# Altium schematic symbol library Electronic Devices_LIB.SchLib: 703 symbols (part 5 of 8) (continued)
## IC_POWER_SW_TPS27081ADDCR (continued)
IC LOAD SW HIGH SIDE 6SOT; Manufacturer: Texas Instruments; Number of Outputs: 1; Output Current: 3A; Max Power Dissipation: 1.19W; Max Supply Voltage: 8V; Min Supply Voltage: 1.2V; On-State Resistance: 155mR; Interface: On/Off; Number of Drivers: 2; Supplier 1: Digikey; Manufacturer Part Number: TPS27081ADDCR; RoHS: Yes; Category: Hot Swap Controllers; Stock 1: 25350; Pricing 1: 1=0.87, 10=0.768, 25=0.7212, 100=0.5885, 250=0.54668, 500=0.46524, 1000=0.3722 (USD); Mount: Surface Mount; Case/Package: SOT-23-6; Number of Pins: 6; Weight: 0.00127oz; Min Operating Temperature: -40°C; Max Operating Temperature: 85°C; Packaging: Tape and Reel; Package Quantity: 3000; Max Output Current: 3A; Power Dissipation: 1.19W; Number of Channels: 1; Output Configuration: High Side; Series: -; Length: 3.02mm; Width: 1.75mm; Height: 0.8mm; Radiation Hardening: No; Reach SVHC Compliant: No; Lead Free: Lead Free; RoHS Compliant: Yes; ComponentLink1URL: https://datasheet.ciiva.com/23784/1759795-23784067.pdf?src-supplier=Newark; ComponentLink1Description: https://datasheet.ciiva.com/23784/1759795-23784067.pdf?src-supplier=Newark; ComponentLink2URL: https://datasheet.ciiva.com/22629/tps27081a-22629123.pdf?src-supplier=Element14; ComponentLink2Description: https://datasheet.ciiva.com/22629/tps27081a-22629123.pdf?src-supplier=Element14; ComponentLink3URL: https://datasheet.ciiva.com/6602/tps27081a-6602781.pdf?src-supplier=Digikey; ComponentLink3Description: https://datasheet.ciiva.com/6602/tps27081a-6602781.pdf?src-supplier=Digikey; ComponentLink4URL: https://datasheet.ciiva.com/6602/tps27081a-6602782.pdf?src-supplier=Digikey; ComponentLink4Description: https://datasheet.ciiva.com/6602/tps27081a-6602782.pdf?src-supplier=Digikey; ComponentLink5URL: https://datasheet.ciiva.com/6602/tps27081a-6602783.pdf?src-supplier=Digikey; ComponentLink5Description: https://datasheet.ciiva.com/6602/tps27081a-6602783.pdf?src-supplier=Digikey; ComponentLink6URL: https://datasheet.ciiva.com/26909/getdatasheetpartid-643010-26909270.pdf?src-supplier=Verical; ComponentLink6Description: https://datasheet.ciiva.com/26909/getdatasheetpartid-643010-26909270.pdf?src-supplier=Verical; ComponentLink7URL: https://datasheet.ciiva.com/14247/tps27081a-14247815.pdf?src-supplier=Avnet; ComponentLink7Description: https://datasheet.ciiva.com/14247/tps27081a-14247815.pdf?src-supplier=Avnet; ComponentLink8URL: https://datasheet.ciiva.com/14248/tps27081a-14248285.pdf?src-supplier=Avnet; ComponentLink8Description: https://datasheet.ciiva.com/14248/tps27081a-14248285.pdf?src-supplier=Avnet; Supplier Part Number 1: 296-34970-1-ND
footprint IC_POWER_SW_SOT95P280X110-6N (SOT-23-THIN)
pins: 1 R2, 2 VOUT_1, 3 VOUT_2, 4 VIN, 5 ON/OFF, 6 R1/C1

## IC_PROTECTION_USB_TYPEC_NX20P0407UKZ
designator U?, comment NX20P0407UKZ
IC USB TYPE C PROTECTION +15KV/+8KV ESD WLCSP12; Manufacturer: NXP Semiconductors; Supplier 1: Digikey; Manufacturer Part Number: NX20P0407UKZ; RoHS: No; Stock 1: 96420; Pricing 1: 1=1.73, 10=1.44, 100=1.1464, 500=0.97006, 1000=0.82309, 2000=0.78194, 5000=0.75254 (USD); Supplier Part Number 1: 568-15315-1-ND
footprint IC_PROTECTION_USBC_BGA12C40P3X4_127X167X56
pins: A1 CON__CC1, A2 CC1, A3 VSYS, B1 CON__CC2, B2 CC2, B3 GND, C1 CON__SBU1, C2 SBU1, C3 FLAG, D1 CON__SBU2, D2 SBU2, D3 SBUEN

## IC_PUSHB_ONOFF_MAX16054AZT+T
designator U?, comment MAX16054AZT+T
MAX16054 Series 5.5 V Surface Mount Pushbutton On/Off Controller - TSOT-23-6; Manufacturer: Analog Devices; Max Power Dissipation: 727mW; Max Supply Voltage: 5.5V; Min Supply Voltage: 2.7V; Number of Voltages Monitored: 1; Operating Supply Current: 7uA; Undervoltage Threshold: 1.8V; Watchdog Timer: No; Output Type: 10620OutputType; Supplier 1: Newark; Manufacturer Part Number: MAX16054AZT+T; RoHS: No; Category: Interface ICs; Stock 1: 3185; Pricing 1: 1=2.01, 10=1.85, 25=1.85, 50=1.85, 100=1.71, 250=1.71, 500=1.71, 1000=1.58 (USD); Mount: Surface Mount; Case/Package: SOT-23-6; Number of Pins: 6; Contact Plating: Tin; Min Operating Temperature: -40°C; Max Operating Temperature: 125°C; Packaging: Cut Tape; Nominal Supply Current: 7uA; Number of Outputs: 1; Length: 4mm; Width: 4mm; Height: 1.1mm; Radiation Hardening: No; Reach SVHC Compliant: Unknown; Supplier Part Number 1: 73Y2456
footprint IC_SOT95P275X110-6N
pins: 1 IN, 2 GND, 3 CLEAR, 4 ~{OUT}, 5 OUT, 6 VCC

## IC_REG_BOOST_5V_1.5A_TPS61023DRLT
designator U?, comment TPS61023DRLT
3.7-A boost converter with 0.5-V ultra-low input voltage 6-SOT-5X3 -40 to 125; Manufacturer: Texas Instruments; Output Type: Adjustable; Output Configuration: Positive; Number of Outputs: 1; Min Input Voltage: 500mV; Max Input Voltage: 5.5V; Min Output Voltage: 2.2V; Output Current: 3A; Switching Frequency: 1MHz; Synchronous Rectifier: Yes; Supplier 1: Digikey; Manufacturer Part Number: TPS61023DRLT; RoHS: Yes; Category: Voltage Regulators - Switching; Stock 1: 20677; Pricing 1: 1=1.18, 10=1.052, 25=0.9984, 100=0.82 (USD); Mount: Surface Mount; Case/Package: SOT-563; Min Operating Temperature: -40°C; Max Operating Temperature: 125°C; Topology: Boost; Series: -; Max Output Voltage: 5.5V; ComponentLink1URL: http://www.ti.com/general/docs/suppproductinfo.tsp?distId=10&amp;gotoUrl=http%3A%2F%2Fwww.ti.com%2Flit%2Fgpn%2Ftps61023&src-supplier=Digikey; ComponentLink1Description: http://www.ti.com/general/docs/suppproductinfo.tsp?distId=10&amp;gotoUrl=http%3A%2F%2Fwww.ti.com%2Flit%2Fgpn%2Ftps61023&src-supplier=Digikey; Supplier Part Number 1: 296-TPS61023DRLTCT-ND
footprint IC_REG_BOOST_SOTFL50P160X60-6N (SOT-563)
pins: 1 FB, 2 EN, 3 VIN, 4 GND, 5 SW, 6 VOUT

## IC_REG_BOOST_5V_1A_PAM2401SCADJ
designator U?, comment PAM2401SCADJ
Conv DC-DC 0.9V to 4.75V Synchronous Step Up Single-Out 2.5V to 5V 8-Pin MSOP T/R; Manufacturer: Diodes; Number of Outputs: 1; Min Input Voltage: 900mV; Output Current: 3A; Switching Frequency: 1MHz; Synchronous Rectifier: Yes; Operating Supply Current: 1uA; Topology: Boost; Output Type: Adjustable; Output Configuration: Positive; Supplier 1: Digikey; Manufacturer Part Number: PAM2401SCADJ; RoHS: Yes; Category: Voltage Regulators - Switching; Stock 1: 13690; Pricing 1: 1=1, 10=0.894, 25=0.8484, 100=0.6969, 250=0.65144, 500=0.5757, 1000=0.4545 (USD); Mount: Surface Mount; Case/Package: MSOP; Weight: 0.004938oz; Min Operating Temperature: -40°C; Max Operating Temperature: 85°C; Packaging: Tape and Reel; Max Input Voltage: 4.75V; Min Output Voltage: 2.5V; Max Output Voltage: 5V; Package Quantity: 2500; Min Supply Voltage: 900mV; Series: -; Number of Channels: 1; Lead Free: Lead Free; RoHS Compliant: Yes; ComponentLink1URL: http://www.mouser.com/ds/2/115/PAM2401-347378.pdf?src-supplier=Mouser; ComponentLink1Description: http://www.mouser.com/ds/2/115/PAM2401-347378.pdf?src-supplier=Mouser; ComponentLink2URL: https://www.diodes.com/assets/Datasheets/PAM2401.pdf?src-supplier=Digikey; ComponentLink2Description: https://www.diodes.com/assets/Datasheets/PAM2401.pdf?src-supplier=Digikey; ComponentLink3URL: http://diodes.com/datasheets/PAM2401.pdf?src-supplier=Avnet; ComponentLink3Description: http://diodes.com/datasheets/PAM2401.pdf?src-supplier=Avnet; Supplier Part Number 1: PAM2401SCADJDICT-ND

## IC_REG_BOOST_8A_TPS61089RNRR
designator U?, comment TPS61089RNRR
Conv DC-DC 2.7V to 12V Synchronous Step Up Single-Out 4.5V to 12.6V 7A 11-Pin VQFN-HR T/R; Manufacturer: Texas Instruments; Number of Outputs: 1; Switching Frequency: 2.2MHz; Synchronous Rectifier: Yes; Quiescent Current: 10uA; Topology: Boost; Output Type: Adjustable; Output Configuration: Positive; Supplier 1: Mouser; Manufacturer Part Number: TPS61089RNRR; RoHS: Yes; Category: Voltage Regulators - Switching; Stock 1: 27007; Pricing 1: 1=2.62, 10=2.35, 50=2.35, 100=1.89, 250=1.77, 500=1.55, 1000=1.28, 3000=1.19, 6000=1.15, 9000=1.11, 10000=1.15 (USD); Mount: Surface Mount; Case/Package: VQFN; Number of Pins: 11; Min Operating Temperature: -40°C; Max Operating Temperature: 85°C; Packaging: Tape and Reel; Min Input Voltage: 2.7V; Max Input Voltage: 12V; Min Output Voltage: 4.5V; Max Output Voltage: 12.6V; Output Current: 7A; Series: -; Lead Free: Lead Free; RoHS Compliant: Yes; Supplier Part Number 1: 595-TPS61089RNRR
footprint IC_REG_BOOST_TPS61089RNRR (11-VQFN-HR (2.5x2))
pins: 1 FSW (in), 2 VCC (out), 3 FB (in), 4 COMP (out), 5 GND (power), 6 VOUT (out), 7 EN (in), 8 ILIM (out), 9 VIN (in), 10 BOOT (out), 11 SW (out)

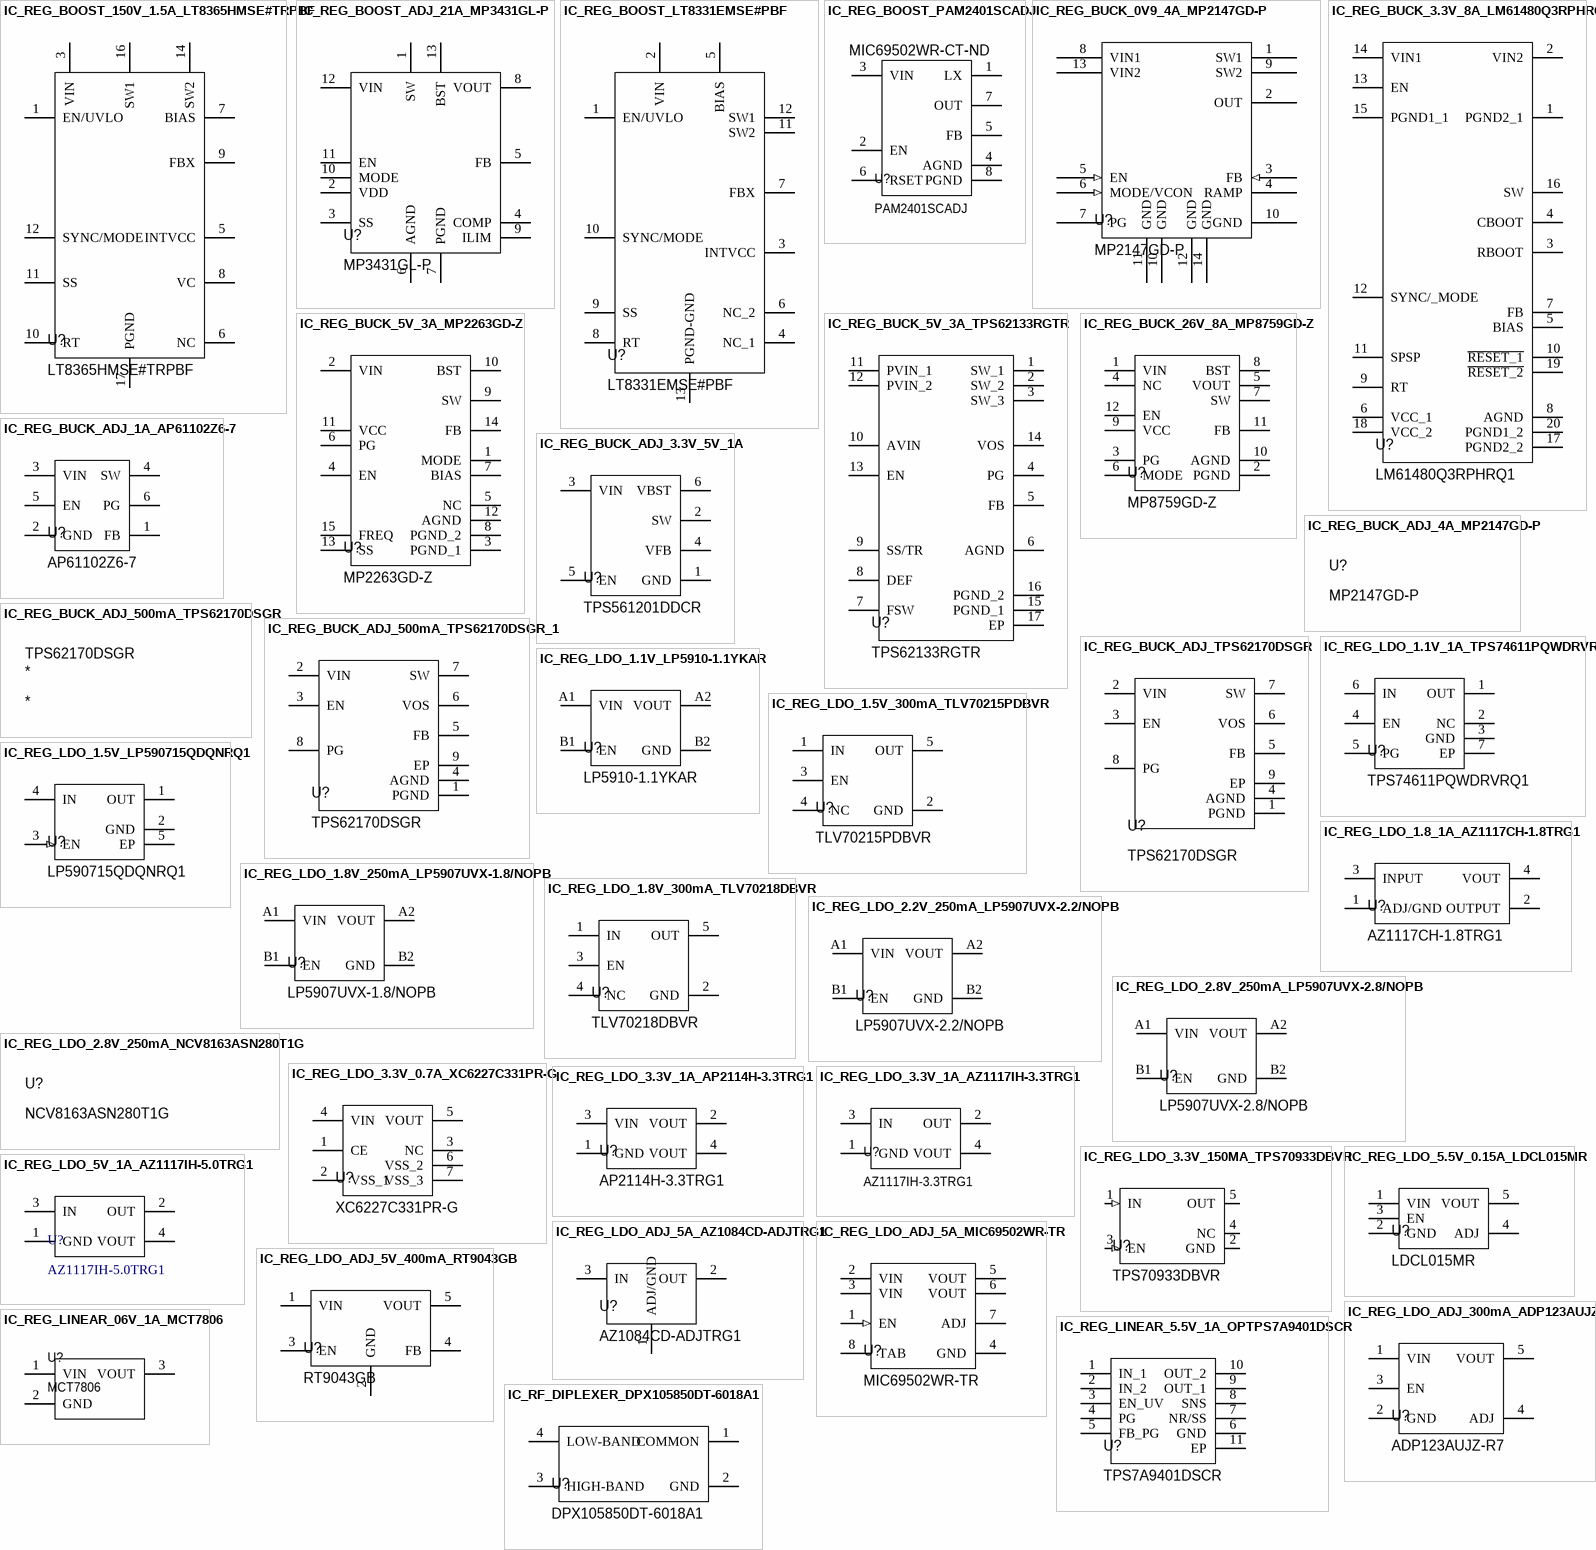
[diagram p26: symbols IC_REG_BOOST_150V_1.5A_LT8365HMSE#TRPBF to IC_RF_DIPLEXER_DPX105850DT-6018A1]

## IC_REG_BOOST_150V_1.5A_LT8365HMSE#TRPBF
designator U?, comment LT8365HMSE#TRPBF
60 Vin Boost/sepic/inv Conv 1.5A/; Manufacturer: Analog Devices; Supplier 1: Mouser; Manufacturer Part Number: LT8365HMSE#TRPBF; RoHS: Yes; Category: Voltage Regulators - Switching; Stock 1: 7423; Pricing 1: 1=7.4, 10=6.69, 50=6.38, 100=5.54, 1000=4.2, 10000=3.75 (USD); Supplier Part Number 1: 584-LT8365HMSE#TRPBF
footprint IC_BOOST_MSE16(12) (16-MSOP-EP)
pins: 1 EN/UVLO, 3 VIN, 5 INTVCC, 6 NC, 7 BIAS, 8 VC, 9 FBX, 10 RT, 11 SS, 12 SYNC/MODE, 14 SW2, 16 SW1, 17 PGND

## IC_REG_BOOST_ADJ_21A_MP3431GL-P
designator U?, comment MP3431GL-P
21A, High-Efficiency, Fully Integrated, Synchronous, Boost Converter with Progra; Manufacturer: Monolithic Power Systems; Supplier 1: Mouser; Manufacturer Part Number: MP3431GL-P; RoHS: No; Category: Voltage Regulators - Switching; Stock 1: 7933; Pricing 1: 1=4.68, 10=3.64, 50=3.64, 100=3.62, 250=3.15, 500=2.13, 1000=1.79, 2500=1.7, 5000=1.64, 10000=1.7 (USD); Mount: Surface Mount; Case/Package: QFN; Number of Pins: 13; Packaging: Tape and Reel; Series: *; ComponentLink1URL: https://datasheet.octopart.com/MP3431GL-P-Monolithic-Power-Systems-datasheet-156108963.pdf?src-supplier=Monolithic+Power+Systems; ComponentLink1Description: https://datasheet.octopart.com/MP3431GL-P-Monolithic-Power-Systems-datasheet-156108963.pdf?src-supplier=Monolithic+Power+Systems; Supplier Part Number 1: 946-MP3431GL-P
footprint IC_REG_BOOST_MP3431GLP (QFN-13)
pins: 1 SW, 2 VDD, 3 SS, 4 COMP, 5 FB, 6 AGND, 7 PGND, 8 VOUT, 9 ILIM, 10 MODE, 11 EN, 12 VIN, 13 BST

## IC_REG_BOOST_LT8331EMSE#PBF
designator U?, comment LT8331EMSE#PBF
Conv DC-DC 4.5V to 100V Step Up Single-Out 1.6V to 140V Automotive Medical 12-Pin MSOP EP Tube; Manufacturer: Analog Devices / Linear Technology; Number of Outputs: 1; Min Output Voltage: -800mV; Output Current: 500mA; Switching Frequency: 500kHz; Synchronous Rectifier: No; Topology: Boost,Flyback,SEPIC; Output Type: Adjustable; Supplier 1: Mouser; Manufacturer Part Number: LT8331EMSE#PBF; RoHS: Yes; Category: Voltage Regulators - Switching; Stock 1: 9922; Pricing 1: 1=8.51, 10=7.69, 50=6.37, 100=6.37, 1000=4.82, 10000=4.82 (USD); Mount: Surface Mount; Case/Package: MSOP; Number of Pins: 16; Min Operating Temperature: -40°C; Max Operating Temperature: 125°C; Packaging: Rail/Tube; Min Input Voltage: 4.5V; Max Input Voltage: 100V; Max Output Voltage: 140V; Output Voltage: 140V; Series: -; Reach SVHC Compliant: No; RoHS Compliant: Yes; ComponentLink1URL: http://www.farnell.com/datasheets/2150272.pdf?src-supplier=Farnell; ComponentLink1Description: http://www.farnell.com/datasheets/2150272.pdf?src-supplier=Farnell; ComponentLink2URL: https://datasheet.octopart.com/LT8331EMSE%23PBF-Linear-Technology-datasheet-57699019.pdf?src-supplier=Newark; ComponentLink2Description: https://datasheet.octopart.com/LT8331EMSE%23PBF-Linear-Technology-datasheet-57699019.pdf?src-supplier=Newark; ComponentLink3URL: http://www.linear.com/docs/43836?src-supplier=Digi-Key; ComponentLink3Description: http://www.linear.com/docs/43836?src-supplier=Digi-Key; ComponentLink4URL: https://datasheet.octopart.com/LT8331EMSE%23PBF-Analog-Devices-datasheet-152738610.pdf?src-supplier=Element14; ComponentLink4Description: https://datasheet.octopart.com/LT8331EMSE%23PBF-Analog-Devices-datasheet-152738610.pdf?src-supplier=Element14; ComponentLink5URL: http://www.farnell.com/datasheets/2150272.pdf?src-supplier=Element14; ComponentLink5Description: http://www.farnell.com/datasheets/2150272.pdf?src-supplier=Element14; Supplier Part Number 1: 584-LT8331EMSE#PBF
footprint IC_BOOST_MSE16(12) (16-MSOP-EP)
pins: 1 EN/UVLO, 2 VIN, 3 INTVCC, 4 NC_1, 5 BIAS, 6 NC_2, 7 FBX, 8 RT, 9 SS, 10 SYNC/MODE, 11 SW2, 12 SW1, 13 PGND-GND

## IC_REG_BOOST_PAM2401SCADJ
designator U?, comment PAM2401SCADJ  Supplier Part Number 2: MIC69502WR-CT-ND
IC REG BOOST ADJ 3A SYNC 8MSOP; Manufacturer: Diodes; Number of Outputs: 1; Min Input Voltage: 900mV; Max Input Voltage: 4.75V; Min Output Voltage: 2.5V; Max Output Voltage: 5V; Switching Frequency: 1MHz; Synchronous Rectifier: Yes; Operating Supply Current: 1uA; Output Type: Adjustable; Output Configuration: Positive; Supplier 1: Digi-Key; Manufacturer Part Number: PAM2401SCADJ; RoHS: Yes; Category: Voltage Regulators - Switching; Stock 1: 21873; Pricing 1: 1=1, 10=0.894, 25=0.8484, 100=0.6969, 250=0.65144, 500=0.5757, 1000=0.4545 (USD); Mount: Surface Mount; Case/Package: MSOP; Weight: 0.004938oz; Min Operating Temperature: -40°C; Max Operating Temperature: 85°C; Packaging: Tape and Reel; Output Current: 3A; Package Quantity: 2500; Min Supply Voltage: 900mV; Topology: Boost; Series: -; Lead Free: Lead Free; RoHS Compliant: Yes; ComponentLink1URL: http://www.mouser.com/ds/2/115/PAM2401-347378.pdf?src-supplier=Mouser; ComponentLink1Description: http://www.mouser.com/ds/2/115/PAM2401-347378.pdf?src-supplier=Mouser; ComponentLink2URL: http://diodes.com/datasheets/PAM2401.pdf?src-supplier=Avnet; ComponentLink2Description: http://diodes.com/datasheets/PAM2401.pdf?src-supplier=Avnet; ComponentLink3URL: https://www.diodes.com/assets/Datasheets/PAM2401.pdf?src-supplier=Digi-Key; ComponentLink3Description: https://www.diodes.com/assets/Datasheets/PAM2401.pdf?src-supplier=Digi-Key; Supplier Part Number 1: PAM2401SCADJDIDKR-ND; Supplier 2: Digikey
footprint IC_BOOST_SOP65P490X110-8N (8MSOP (0.118", 3.00mm Width))
pins: 1 LX, 2 EN, 3 VIN, 4 AGND, 5 FB, 6 RSET, 7 OUT, 8 PGND

## IC_REG_BUCK_0V9_4A_MP2147GD-P
designator U?, comment MP2147GD-P
IC Reg Buck Adjustable 4A 12QFN; Manufacturer: Monolithic Power Systems; Number of Outputs: 1; Output Voltage: 5.5V; Min Input Voltage: 2.8V; Min Output Voltage: 600mV; Switching Frequency: 1.2MHz; Synchronous Rectifier: Yes; Operating Supply Current: 40uA; Output Configuration: Positive; Supplier 1: Digi-Key; Manufacturer Part Number: MP2147GD-P; RoHS: Yes; Category: Voltage Regulators - Switching; Stock 1: 1866; Pricing 1: 1=5.09, 10=4.567, 25=4.3176, 100=3.742, 250=3.55016 (USD); Mount: Surface Mount; Case/Package: QFN; Number of Pins: 12; Weight: 0.000776oz; Min Operating Temperature: -40°C; Max Operating Temperature: 125°C; Packaging: Tape and Reel; Package Quantity: 500; Series: -; Max Output Current: 4A; Max Input Voltage: 5.5V; Max Output Voltage: 5.5V; Output Current: 4A; Operating Supply Voltage: 5.5V; Output Type: Adjustable; Radiation Hardening: No; ComponentLink1URL: http://www.mouser.com/ds/2/277/MP2147_r1.1-523188.pdf?src-supplier=Mouser; ComponentLink1Description: http://www.mouser.com/ds/2/277/MP2147_r1.1-523188.pdf?src-supplier=Mouser; ComponentLink2URL: https://www.monolithicpower.com/pub/media/document/MP2147_r1.1.pdf?src-supplier=Digi-Key; ComponentLink2Description: https://www.monolithicpower.com/pub/media/document/MP2147_r1.1.pdf?src-supplier=Digi-Key; ComponentLink3URL: http://www.monolithicpower.com/DesktopModules/DocumentManage/API/Document/GetDocument?id=2970&src-supplier=Avnet; ComponentLink3Description: http://www.monolithicpower.com/DesktopModules/DocumentManage/API/Document/GetDocument?id=2970&src-supplier=Avnet; ComponentLink4URL: https://datasheet.octopart.com/MP2147GD-P-Monolithic-Power-Systems-datasheet-155982077.pdf?src-supplier=Monolithic+Power+Systems; ComponentLink4Description: https://datasheet.octopart.com/MP2147GD-P-Monolithic-Power-Systems-datasheet-155982077.pdf?src-supplier=Monolithic+Power+Systems; Supplier Part Number 1: 1589-MP2147GD-PCT-ND
footprint IC_REG_MP2147GDP (12-QFN (2x3))
pins: 1 SW1 (power), 2 OUT (power), 3 FB (in), 4 RAMP, 5 EN (in), 6 MODE/VCON (in), 7 PG (oc), 8 VIN1 (power), 9 SW2 (power), 10 GND, 10 GND (power), 11 GND, 12 GND, 13 VIN2 (power), 14 GND

## IC_REG_BUCK_3.3V_8A_LM61480Q3RPHRQ1
designator U?, comment LM61480Q3RPHRQ1
8-A automotive buck converter optimized for power density and low EMI 16-VQFN-HR -40 to 150; Manufacturer: Texas Instruments; Supplier 1: Mouser; Manufacturer Part Number: LM61480Q3RPHRQ1; RoHS: No; Category: Voltage Regulators - Switching; Stock 1: 4226; Pricing 1: 1=6.57, 10=5.58, 50=5.58, 100=4.84, 250=4.59, 500=4.12, 1000=3.47, 3000=3.37, 10000=3.37 (USD); RoHS Compliant: Yes; Supplier Part Number 1: 595-LM61480Q3RPHRQ1
footprint IC_REG_LM62460QRPHRQ1 (16-PowerVFQFN)
pins: 1 PGND2_1, 2 VIN2, 3 RBOOT, 4 CBOOT, 5 BIAS, 6 VCC_1, 7 FB, 8 AGND, 9 RT, 10 ~{RESET_1}, 11 SPSP, 12 SYNC/_MODE, 13 EN, 14 VIN1, 15 PGND1_1, 16 SW, 17 PGND2_2, 18 VCC_2, 19 ~{RESET_2}, 20 PGND1_2

## IC_REG_BUCK_5V_3A_MP2263GD-Z
designator U?, comment MP2263GD-Z
Buck Switching Regulator IC Positive Programmable .05V 1 Output 3A 15-PowerVFQFN; Manufacturer: Monolithic Power Systems; Supplier 1: Digi-Key; Manufacturer Part Number: MP2263GD-Z; RoHS: Yes; Category: Voltage Regulators - Switching; Stock 1: 4650; Pricing 1: 1=2.62, 10=2.355, 25=2.222, 100=1.8931, 250=1.7776, 500=1.5554, 1000=1.28876, 2500=1.19988 (USD); RoHS Compliant: Yes; ComponentLink1URL: https://www.monolithicpower.com/pub/media/document/MP2263_r1.0.pdf?src-supplier=Digi-Key; ComponentLink1Description: https://www.monolithicpower.com/pub/media/document/MP2263_r1.0.pdf?src-supplier=Digi-Key; Supplier Part Number 1: 1589-1574-1-ND
footprint IC_REG_MP2263GDZ (15-QFN (3x2))
pins: 1 MODE, 2 VIN, 3 PGND_1, 4 EN, 5 NC, 6 PG, 7 BIAS, 8 PGND_2, 9 SW, 10 BST, 11 VCC, 12 AGND, 13 SS, 14 FB, 15 FREQ

## IC_REG_BUCK_5V_3A_TPS62133RGTR
designator U?, comment TPS62133RGTR
Conv DC-DC 3V to 17V Synchronous Step Down Single-Out 5V 3A 16-Pin VQFN EP T/R; Manufacturer: Texas Instruments; Number of Outputs: 1; Switching Frequency: 2.5MHz; Synchronous Rectifier: Yes; Quiescent Current: 17uA; Output Type: Fixed; Output Configuration: Positive; Supplier 1: Digikey; Manufacturer Part Number: TPS62133RGTR; RoHS: Yes; Category: Voltage Regulators - Switching; Stock 1: 4558; Pricing 1: 1=1.83, 10=1.646, 25=1.5528, 100=1.323, 250=1.24232, 500=1.08702, 1000=0.90067, 3000=0.83855, 6000=0.8075 (USD); Case/Package: QFN; Number of Pins: 16; Min Operating Temperature: -40°C; Max Operating Temperature: 125°C; Output Voltage: 5V; Output Current: 3A; Packaging: Tape and Reel; Package Quantity: 1; Max Output Current: 3A; Max Input Voltage: 17V; Min Input Voltage: 3V; Min Output Voltage: 5V; Max Output Voltage: 5V; Operating Supply Voltage: 17V; Series: DCS-Control™; Length: 3mm; Width: 3mm; Height: 1mm; Thickness: 900um; Lead Free: Lead Free; RoHS Compliant: Yes; ComponentLink1URL: https://datasheet.ciiva.com/2026/tps62131-2026576.pdf?src-supplier=Digikey; ComponentLink1Description: https://datasheet.ciiva.com/2026/tps62131-2026576.pdf?src-supplier=Digikey; ComponentLink2URL: https://datasheet.ciiva.com/2035/tps62130-2035262.pdf?src-supplier=Digikey; ComponentLink2Description: https://datasheet.ciiva.com/2035/tps62130-2035262.pdf?src-supplier=Digikey; ComponentLink3URL: https://datasheet.ciiva.com/2035/tps62130-2035263.pdf?src-supplier=Digikey; ComponentLink3Description: https://datasheet.ciiva.com/2035/tps62130-2035263.pdf?src-supplier=Digikey; Supplier Part Number 1: 296-29937-1-ND
footprint IC_REG_QFN50P300X300X100-17N-D
pins: 1 SW_1, 2 SW_2, 3 SW_3, 4 PG, 5 FB, 6 AGND, 7 FSW, 8 DEF, 9 SS/TR, 10 AVIN, 11 PVIN_1, 12 PVIN_2, 13 EN, 14 VOS, 15 PGND_1, 16 PGND_2, 17 EP

## IC_REG_BUCK_26V_8A_MP8759GD-Z
designator U?, comment MP8759GD-Z
Tape & Reel (TR) Active Step-Down Buck DC to DC switching regulator 26V 8A 700kHz -40C~125C TJ; Manufacturer: Monolithic Power Systems; Output Voltage: 600mV; Number of Outputs: 1; Min Input Voltage: 4.5V; Max Output Current: 10A; Output Type: Adjustable; Supplier 1: Digi-Key; Manufacturer Part Number: MP8759GD-Z; RoHS: Yes; Category: Voltage Regulators - Switching; Stock 1: 455; Pricing 1: 1=2.71, 10=2.436, 25=2.2976, 100=1.9577, 250=1.8382, 500=1.60842, 1000=1.3327, 2500=1.24078 (USD); Mount: Surface Mount; Case/Package: QFN; Number of Pins: 14; Contact Plating: Tin,Matte; Min Operating Temperature: -40°C; Max Operating Temperature: 125°C; Max Input Voltage: 26V; Switching Frequency: 700kHz; Operating Supply Voltage: 26V; RoHS Compliant: Yes; ComponentLink1URL: https://www.monolithicpower.com/pub/media/document/MP8759_r1.1.pdf?src-supplier=Digi-Key; ComponentLink1Description: https://www.monolithicpower.com/pub/media/document/MP8759_r1.1.pdf?src-supplier=Digi-Key; ComponentLink2URL: https://datasheet.octopart.com/MP8759GD-Z-Monolithic-Power-Systems-datasheet-104200629.pdf?src-supplier=SHENGYU+ELECTRONICS; ComponentLink2Description: https://datasheet.octopart.com/MP8759GD-Z-Monolithic-Power-Systems-datasheet-104200629.pdf?src-supplier=SHENGYU+ELECTRONICS; ComponentLink3URL: https://datasheet.octopart.com/MP8759GD-Z-Monolithic-Power-Systems-datasheet-155982220.pdf?src-supplier=Monolithic+Power+Systems; ComponentLink3Description: https://datasheet.octopart.com/MP8759GD-Z-Monolithic-Power-Systems-datasheet-155982220.pdf?src-supplier=Monolithic+Power+Systems; Supplier Part Number 1: 1589-1736-1-ND
footprint IC_REG_MP8759GDZ (12-QFN (2x3))
pins: 1 VIN, 2 PGND, 3 PG, 4 NC, 5 VOUT, 6 MODE, 7 SW, 8 BST, 9 VCC, 10 AGND, 11 FB, 12 EN

## IC_REG_BUCK_ADJ_1A_AP61102Z6-7
designator U?, comment AP61102Z6-7
DC to DC Converter Synchronous Buck Converter 1-Output 0.6V to 3.6V 1A 6-Pin SOT-563 T/R; Manufacturer: Diodes; Output Type: Adjustable; Output Configuration: Positive; Number of Outputs: 1; Min Input Voltage: 2.3V; Max Input Voltage: 5.5V; Min Output Voltage: 600mV; Switching Frequency: 2.2MHz; Synchronous Rectifier: Yes; Supplier 1: Digikey; Manufacturer Part Number: AP61102Z6-7; RoHS: No; Category: Voltage Regulators - Switching; Stock 1: 97078; Pricing 1: 1=0.66, 10=0.407, 25=0.3392, 100=0.2616, 250=0.22332, 500=0.19982, 1000=0.18019 (USD); Mount: Surface Mount; Case/Package: SOT-563; Min Operating Temperature: -40°C; Max Operating Temperature: 85°C; Series: -; Max Output Voltage: 3.6V; Output Current: 1A; Supplier Part Number 1: 31-AP61102Z6-7DKR-ND
footprint IC_REG_BUCK_SOTFL50P162X60-6N
pins: 1 FB, 2 GND, 3 VIN, 4 SW, 5 EN, 6 PG

## IC_REG_BUCK_ADJ_3.3V_5V_1A
designator U?, comment TPS561201DDCR
-40°C to 125°C; Manufacturer: Texas Instruments; Number of Outputs: 1; Min Input Voltage: 4.5V; Max Input Voltage: 17V; Output Current: 1A; Switching Frequency: 580kHz; Output Voltage: 7V; Operating Supply Current: 380uA; Supplier 1: Texas Instruments; Manufacturer Part Number: TPS561201DDCR; RoHS: Yes; Category: Voltage Regulators - Switching; Stock 1: 879900; Pricing 1: 1=0.39, 100=0.3, 250=0.221, 1000=0.158 (USD); Case/Package: SOT-23-6; Number of Pins: 6; Weight: 0.000395oz; Min Operating Temperature: -40°C; Max Operating Temperature: 85°C; Packaging: Cut Tape; Series: TPS561201; Package Quantity: 3000; Min Supply Voltage: 4.5V; RoHS Compliant: Yes; ComponentLink1URL: http://www.ti.com/lit/ds/symlink/tps561201.pdf?src-supplier=Digi-Key; ComponentLink1Description: http://www.ti.com/lit/ds/symlink/tps561201.pdf?src-supplier=Digi-Key; ComponentLink2URL: http://www.ti.com/general/docs/suppproductinfo.tsp?distId=10&amp;gotoUrl=http%3A%2F%2Fwww.ti.com%2Flit%2Fgpn%2Ftps561201&src-supplier=Digi-Key; ComponentLink2Description: http://www.ti.com/general/docs/suppproductinfo.tsp?distId=10&amp;gotoUrl=http%3A%2F%2Fwww.ti.com%2Flit%2Fgpn%2Ftps561201&src-supplier=Digi-Key; Supplier Part Number 1: TPS561201DDCR
footprint IC_REG_SOT95P280X110-6N (SOT-23-6 Thin, TSOT-23-6)
pins: 1 GND, 2 SW, 3 VIN, 4 VFB, 5 EN, 6 VBST

## IC_REG_BUCK_ADJ_4A_MP2147GD-P
designator U?, comment MP2147GD-P
IC Reg Buck Adjustable 4A 12QFN; Manufacturer: Monolithic Power Systems; Number of Outputs: 1; Output Voltage: 5.5V; Min Input Voltage: 2.8V; Min Output Voltage: 600mV; Switching Frequency: 1.2MHz; Synchronous Rectifier: Yes; Operating Supply Current: 40uA; Output Configuration: Positive; Supplier 1: Digikey; Manufacturer Part Number: MP2147GD-P; RoHS: Yes; Category: Voltage Regulators - Switching; Stock 1: 1866; Pricing 1: 1=5.09, 10=4.567, 25=4.3176, 100=3.742, 250=3.55016 (USD); Mount: Surface Mount; Case/Package: QFN; Number of Pins: 12; Weight: 0.000776oz; Min Operating Temperature: -40°C; Max Operating Temperature: 125°C; Packaging: Tape and Reel; Package Quantity: 500; Series: -; Max Output Current: 4A; Max Input Voltage: 5.5V; Max Output Voltage: 5.5V; Output Current: 4A; Operating Supply Voltage: 5.5V; Output Type: Adjustable; Radiation Hardening: No; ComponentLink1URL: http://www.mouser.com/ds/2/277/MP2147_r1.1-523188.pdf?src-supplier=Mouser; ComponentLink1Description: http://www.mouser.com/ds/2/277/MP2147_r1.1-523188.pdf?src-supplier=Mouser; ComponentLink2URL: https://www.monolithicpower.com/pub/media/document/MP2147_r1.1.pdf?src-supplier=Digikey; ComponentLink2Description: https://www.monolithicpower.com/pub/media/document/MP2147_r1.1.pdf?src-supplier=Digikey; ComponentLink3URL: http://www.monolithicpower.com/DesktopModules/DocumentManage/API/Document/GetDocument?id=2970&src-supplier=Avnet; ComponentLink3Description: http://www.monolithicpower.com/DesktopModules/DocumentManage/API/Document/GetDocument?id=2970&src-supplier=Avnet; ComponentLink4URL: https://datasheet.octopart.com/MP2147GD-P-Monolithic-Power-Systems-datasheet-155982077.pdf?src-supplier=Monolithic+Power+Systems; ComponentLink4Description: https://datasheet.octopart.com/MP2147GD-P-Monolithic-Power-Systems-datasheet-155982077.pdf?src-supplier=Monolithic+Power+Systems; Supplier Part Number 1: 1589-MP2147GD-PCT-ND

## IC_REG_BUCK_ADJ_500mA_TPS62170DSGR
designator *  Supplier Part Number 1: TPS62170DSGR
Buck Switching Regulator IC Positive Adjustable 0.9V 1 Output 500mA 8-WFDFN Exposed Pad; Manufacturer: Texas Instruments; Output Voltage: 6V; Number of Outputs: 1; Max Input Voltage: 17V; Min Input Voltage: 3V; Switching Frequency: 2.25MHz; Min Output Voltage: 900mV; Synchronous Rectifier: Yes; Quiescent Current: 17uA; Supplier 1: Texas Instruments; Manufacturer Part Number: TPS62170DSGR; RoHS: Yes; Category: Voltage Regulators - Switching; Stock 1: 220323; Pricing 1: 1=0.896, 100=0.74, 250=0.532, 1000=0.4 (USD); Number of Pins: 8; Min Operating Temperature: -40°C; Max Operating Temperature: 125°C; Output Current: 500mA; Packaging: Tape and Reel; Package Quantity: 3000; Max Output Current: 500mA; Max Output Voltage: 6V; Operating Supply Voltage: 17V; Output Type: Adjustable; Output Configuration: Positive; Series: DCS-Control™; Reach SVHC Compliant: No; Lead Free: Lead Free; RoHS Compliant: Yes; ComponentLink1URL: https://datasheet.ciiva.com/4880/slvsat8a-121157-4880709.pdf?src-supplier=Mouser; ComponentLink1Description: https://datasheet.ciiva.com/4880/slvsat8a-121157-4880709.pdf?src-supplier=Mouser; ComponentLink2URL: https://datasheet.ciiva.com/2034/tps62170-2034445.pdf?src-supplier=Digikey; ComponentLink2Description: https://datasheet.ciiva.com/2034/tps62170-2034445.pdf?src-supplier=Digikey; ComponentLink3URL: https://datasheet.ciiva.com/2034/tps62170-2034446.pdf?src-supplier=Digikey; ComponentLink3Description: https://datasheet.ciiva.com/2034/tps62170-2034446.pdf?src-supplier=Digikey; ComponentLink4URL: https://datasheet.ciiva.com/2034/tps62170-2034447.pdf?src-supplier=Digikey; ComponentLink4Description: https://datasheet.ciiva.com/2034/tps62170-2034447.pdf?src-supplier=Digikey; ComponentLink5URL: https://datasheet.ciiva.com/14377/tps62170-14377887.pdf?src-supplier=Avnet; ComponentLink5Description: https://datasheet.ciiva.com/14377/tps62170-14377887.pdf?src-supplier=Avnet

## IC_REG_BUCK_ADJ_500mA_TPS62170DSGR_1
designator U?, comment TPS62170DSGR
Buck Switching Regulator IC Positive Adjustable 0.9V 1 Output 500mA 8-WFDFN Exposed Pad
footprint IC_BUCK_SON50P200X200X80-9N
pins: 1 PGND, 2 VIN, 3 EN, 4 AGND, 5 FB, 6 VOS, 7 SW, 8 PG, 9 EP

## IC_REG_BUCK_ADJ_TPS62170DSGR
designator U?, comment TPS62170DSGR
Buck Switching Regulator IC Positive Adjustable 0.9V 1 Output 500mA 8-WFDFN Exposed Pad; Manufacturer: Texas Instruments; Output Voltage: 6V; Number of Outputs: 1; Max Input Voltage: 17V; Min Input Voltage: 3V; Switching Frequency: 2.25MHz; Min Output Voltage: 900mV; Synchronous Rectifier: Yes; Quiescent Current: 17uA; Supplier 1: Texas Instruments; Manufacturer Part Number: TPS62170DSGR; RoHS: Yes; Category: Voltage Regulators - Switching; Stock 1: 220323; Pricing 1: 1=0.896, 100=0.74, 250=0.532, 1000=0.4 (USD); Number of Pins: 8; Min Operating Temperature: -40°C; Max Operating Temperature: 125°C; Output Current: 500mA; Packaging: Tape and Reel; Package Quantity: 3000; Max Output Current: 500mA; Max Output Voltage: 6V; Operating Supply Voltage: 17V; Output Type: Adjustable; Output Configuration: Positive; Series: DCS-Control™; Reach SVHC Compliant: No; Lead Free: Lead Free; RoHS Compliant: Yes; ComponentLink1URL: https://datasheet.ciiva.com/4880/slvsat8a-121157-4880709.pdf?src-supplier=Mouser; ComponentLink1Description: https://datasheet.ciiva.com/4880/slvsat8a-121157-4880709.pdf?src-supplier=Mouser; ComponentLink2URL: https://datasheet.ciiva.com/2034/tps62170-2034445.pdf?src-supplier=Digikey; ComponentLink2Description: https://datasheet.ciiva.com/2034/tps62170-2034445.pdf?src-supplier=Digikey; ComponentLink3URL: https://datasheet.ciiva.com/2034/tps62170-2034446.pdf?src-supplier=Digikey; ComponentLink3Description: https://datasheet.ciiva.com/2034/tps62170-2034446.pdf?src-supplier=Digikey; ComponentLink4URL: https://datasheet.ciiva.com/2034/tps62170-2034447.pdf?src-supplier=Digikey; ComponentLink4Description: https://datasheet.ciiva.com/2034/tps62170-2034447.pdf?src-supplier=Digikey; ComponentLink5URL: https://datasheet.ciiva.com/14377/tps62170-14377887.pdf?src-supplier=Avnet; ComponentLink5Description: https://datasheet.ciiva.com/14377/tps62170-14377887.pdf?src-supplier=Avnet; Supplier Part Number 1: TPS62170DSGR
footprint IC_BUCK_SON50P200X200X80-9N
pins: 1 PGND, 2 VIN, 3 EN, 4 AGND, 5 FB, 6 VOS, 7 SW, 8 PG, 9 EP
